# Altium footprint library THU.PcbLib: 477 footprints (part 7 of 30)
Each footprint in its own frame and in the unit in brackets; x right, y up, seen from the top. Pads: shape width x height; smd on the part's side, far side on the other; paste and mask are expansions set on the pad; w line width, h text height; cw(c..) or ccw(c..) is an arc to the next point about the centre after c.
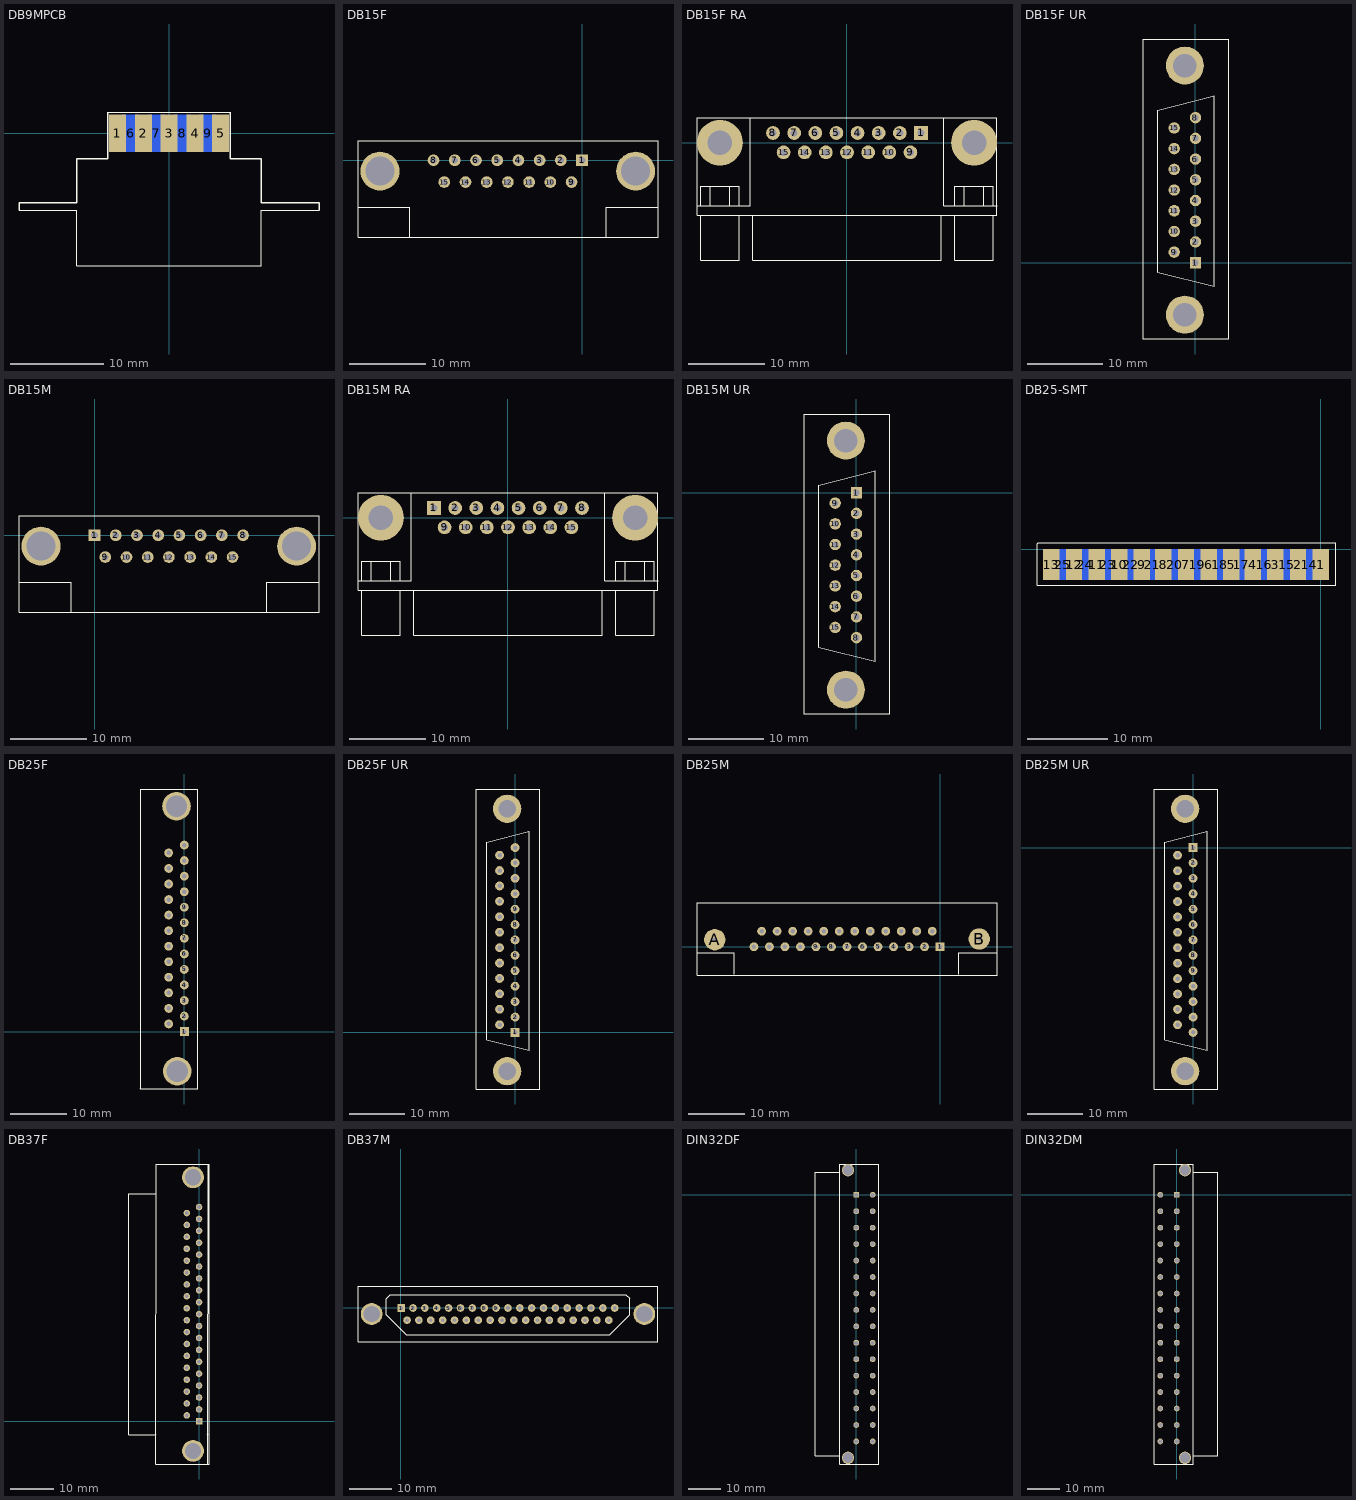
[diagram p6: the footprints below, top view; thin cyan lines are the x and y axes]

## DB9MPCB [mm]
pads (9):
  rect 1.8x4 smd: 1(-5.55,0) 2(-2.75,0) 3(0,0) 4(2.8,0) 5(5.55,0)
  rect 1.8x4 smd far side: 6(-4.125,0) 7(-1.375,0) 8(1.425,0) 9(4.175,0)
TopOverlay:
  lines w0.127: -16.129,-8.255 -9.906,-8.255 -9.906,-14.255 9.906,-14.255 9.906,-8.255 16.129,-8.255 ; -6.604,2.274 -0.009,2.274 6.586,2.274
  lines w0.152: -16.129,-8.255 -16.129,-7.493 -9.906,-7.493 -9.906,-2.726 -6.604,-2.726 -6.604,2.274 ; 6.604,2.274 6.604,-2.726 9.906,-2.726 9.906,-7.493 16.129,-7.493 16.129,-8.255

## DB15F [mil]
pads (17):
  rect 60x60 hole 34: 1(0,0)
  round 60 hole 34: 2(-109,0) 3(-218,0) 4(-327,0) 5(-436,0) 6(-545,0) 7(-654,0) 8(-763,0) 9(-54,-112) 10(-163,-112) 11(-272,-112) 12(-381,-112) 13(-490,-112) 14(-599,-112) 15(-708,-112)
  round 200 hole 149: ""(-1038,-56) ""(275,-56)
TopOverlay:
  lines w6: -1148,-240 -885,-240 -885,-393 ; 125,-393 125,-240 388,-240 ; -1151,-395 -1151,100 390,100 390,-395 -1151,-395

## DB15F RA [mm] "FEMALE DB 15 RA - TYCO CONNECTOR"
height 13.575
pads (17):
  rect 1.8x1.8 hole 0.9: 1(9.695,1.27)
  round 1.8 hole 0.9: 2(6.925,1.27) 3(4.155,1.27) 4(1.385,1.27) 5(-1.385,1.27) 6(-4.155,1.27) 7(-6.925,1.27) 8(-9.695,1.27) 9(8.31,-1.27) 10(5.54,-1.27) 11(2.77,-1.27) 12(0,-1.27) 13(-2.77,-1.27) 14(-5.54,-1.27) 15(-8.31,-1.27)
  round 6 hole 3.2: ""(-16.65,0) ""(16.65,0)
TopOverlay:
  lines w0.152: -19.65,-8.255 -12.7,-8.255 -12.7,3.28 ; -19.177,-9.52 -19.177,-15.42 -14.123,-15.42 -14.123,-9.52 ; -19.177,-8.255 -19.177,-5.715 -14.097,-5.715 -14.097,-8.255 ; -17.907,-8.255 -17.907,-5.715 ; -16.65,0 -16.637,0.013 ; -15.367,-8.255 -15.367,-5.715 ; -12.319,-9.52 -12.319,-15.42 12.319,-15.42 12.319,-9.52 ; 12.7,3.28 12.7,-8.255 19.65,-8.255 ; 14.097,-8.255 14.097,-5.715 19.177,-5.715 19.177,-8.255 ; 14.123,-9.52 14.123,-15.42 19.177,-15.42 19.177,-9.52 ; 15.367,-8.255 15.367,-5.715 ; 17.907,-8.255 17.907,-5.715 ; -19.65,-9.52 -19.65,3.28 19.65,3.28 19.65,-9.52 -19.65,-9.52

## DB15F UR [mil]
pads (17):
  rect 60x60 hole 34: 1(0,0)
  round 60 hole 34: 2(0,109) 3(0,218) 4(0,327) 5(0,436) 6(0,545) 7(0,654) 8(0,763) 9(-112,55) 10(-112,164) 11(-112,273) 12(-112,382) 13(-112,491) 14(-112,600) 15(-112,709)
  round 200 hole 124: ""(-56,-274) ""(-56,1037)
TopOverlay:
  lines w6: -275,-402 -275,1177 175,1177 175,-48 175,-400 -275,-400 ; -200,-50 -200,802 100,877 100,-125 -200,-50

## DB15M [mil]
pads (17):
  rect 60x60 hole 34: 1(0,0)
  round 60 hole 34: 2(109,0) 3(218,0) 4(327,0) 5(436,0) 6(545,0) 7(654,0) 8(763,0) 9(55,-112) 10(164,-112) 11(273,-112) 12(382,-112) 13(491,-112) 14(600,-112) 15(709,-112)
  round 200 hole 149: ""(-275,-56) ""(1038,-56)
TopOverlay:
  lines w6: -383,-240 -120,-240 -120,-393 ; 885,-393 885,-240 1148,-240 ; -388,-395 -388,100 1153,100 1153,-395 -388,-395

## DB15M RA [mm] "MALE DB 15 RA - TYCO CONNECTOR"
height 13.575
pads (17):
  rect 1.8x1.8 hole 0.9: 1(-9.695,1.27)
  round 1.8 hole 0.9: 2(-6.925,1.27) 3(-4.155,1.27) 4(-1.385,1.27) 5(1.385,1.27) 6(4.155,1.27) 7(6.925,1.27) 8(9.695,1.27) 9(-8.31,-1.27) 10(-5.54,-1.27) 11(-2.77,-1.27) 12(0,-1.27) 13(2.77,-1.27) 14(5.54,-1.27) 15(8.31,-1.27)
  round 6 hole 3.2: ""(-16.65,0) ""(16.65,0)
TopOverlay:
  lines w0.152: -19.65,-8.255 -12.7,-8.255 -12.7,3.28 ; -19.177,-9.52 -19.177,-15.42 -14.123,-15.42 -14.123,-9.52 ; -19.177,-8.255 -19.177,-5.715 -14.097,-5.715 -14.097,-8.255 ; -17.907,-8.255 -17.907,-5.715 ; -16.65,0 -16.637,0.013 ; -15.367,-8.255 -15.367,-5.715 ; -12.319,-9.52 -12.319,-15.42 12.319,-15.42 12.319,-9.52 ; 12.7,3.28 12.7,-8.255 19.65,-8.255 ; 14.097,-8.255 14.097,-5.715 19.177,-5.715 19.177,-8.255 ; 14.123,-9.52 14.123,-15.42 19.177,-15.42 19.177,-9.52 ; 15.367,-8.255 15.367,-5.715 ; 17.907,-8.255 17.907,-5.715 ; -19.65,-9.52 19.65,-9.52 19.65,3.28 -19.65,3.28 -19.65,-9.52

## DB15M UR [mil]
pads (17):
  rect 60x60 hole 34: 1(0,0)
  round 60 hole 34: 2(0,-109) 3(0,-218) 4(0,-327) 5(0,-436) 6(0,-545) 7(0,-654) 8(0,-763) 9(-112,-55) 10(-112,-164) 11(-112,-273) 12(-112,-382) 13(-112,-491) 14(-112,-600) 15(-112,-709)
  round 200 hole 124: ""(-56,-1037) ""(-56,274)
TopOverlay:
  lines w6: -275,-1165 -275,414 175,414 175,-811 175,-1163 -275,-1163 ; -200,-813 100,-888 100,114 -200,39 -200,-813

## DB25-SMT [mil]
pads (25):
  rect 80x150 smd: 1(0,-75) 2(-110,-75) 3(-220,-75) 4(-330,-75) 5(-435,-75) 6(-545,-75) 7(-655,-75) 8(-765,-75) 9(-870,-75) 10(-980,-75) 11(-1090,-75) 12(-1200,-75) 13(-1310,-75)
  rect 80x150 smd far side: 14(-55,-75) 15(-165,-75) 16(-275,-75) 17(-385,-75) 18(-490,-75) 19(-600,-75) 20(-710,-75) 21(-820,-75) 22(-925,-75) 23(-1035,-75) 24(-1145,-75) 25(-1255,-75)
TopOverlay:
  lines w6: -1380,-175 -1380,25 -1375,30 75,30 75,-175 -1380,-175

## DB25F [mil]
pads (27):
  rect 62x62 hole 32: 1(0,0)
  round 62 hole 32: 2(0,109) 3(0,218) 4(0,327) 5(0,436) 6(0,545) 7(0,654) 8(0,763) 9(0,872) 10(0,981) 11(0,1090) 12(0,1199) 13(0,1308) 14(-110,54) 15(-110,163) 16(-110,272) 17(-110,381) 18(-110,490) 19](-110,599) 20(-110,708) 21(-110,817) 22(-110,926) 23(-110,1035) 24(-110,1144) 25(-110,1253)
  round 200 hole 149: ""(-55,1580) ""(-50,-277)
TopOverlay:
  lines w6: -310,-400 -307,-397 -307,1701 95,1701 95,-402 ; -308,-402 95,-402 ; 93,-400 95,-402

## DB25F UR [mil]
pads (27):
  rect 62x62 hole 32: 1(0,0)
  round 62 hole 32: 2(0,109) 3(0,218) 4(0,327) 5(0,436) 6(0,545) 7(0,654) 8(0,763) 9(0,872) 10(0,981) 11(0,1090) 12(0,1199) 13(0,1308) 14(-110,55) 15(-110,164) 16(-110,273) 17(-110,382) 18(-110,491) 19(-110,600) 20(-110,709) 21(-110,818) 22(-110,927) 23(-110,1036) 24(-110,1145) 25(-110,1254)
  round 200 hole 124: ""(-56,-274) ""(-56,1582)
TopOverlay:
  lines w6: 175,497 175,1722 -275,1722 -275,-400 175,-400 175,498 ; -200,-50 -200,1347 100,1422 100,-125 -200,-50

## DB25M [mil]
pads (27):
  rect 62x62 hole 32: 1(0,0)
  round 62 hole 32: 2(-109,0) 3(-218,0) 4(-327,0) 5(-436,0) 6(-545,0) 7(-654,0) 8(-763,0) 9(-872,0) 10(-981,0) 11(-1090,0) 12(-1199,0) 13(-1308,0) 14(-55,110) 15(-164,110) 16(-273,110) 17(-382,110) 18(-491,110) 19(-600,110) 20(-709,110) 21(-818,110) 22(-927,110) 23(-1036,110) 24(-1145,110) 25(-1254,110)
  round 150 hole 32: A(-1583,50) B(275,55)
TopOverlay:
  lines w6: -1708,-40 -1445,-40 -1445,-193 ; 130,-193 130,-40 393,-40 ; -1708,-200 -1708,310 400,310 400,-200 -1708,-200

## DB25M UR [mil]
pads (27):
  rect 62x62 hole 32: 1(0,0)
  round 62 hole 32: 2(0,-109) 3(0,-218) 4(0,-327) 5(0,-436) 6(0,-545) 7(0,-654) 8(0,-763) 9(0,-872) 10(0,-981) 11(0,-1090) 12(0,-1199) 13(0,-1308) 14(-110,-55) 15(-110,-164) 16(-110,-273) 17(-110,-382) 18(-110,-491) 19(-110,-600) 20(-110,-709) 21(-110,-818) 22(-110,-927) 23(-110,-1036) 24(-110,-1145) 25(-110,-1254)
  round 200 hole 124: ""(-56,-1582) ""(-56,274)
TopOverlay:
  lines w6: 175,-811 175,414 -275,414 -275,-1708 175,-1708 175,-810 ; -200,-1358 -200,39 100,114 100,-1433 -200,-1358

## DB37F [mil]
pads (39):
  rect 60x60 hole 34: 1(0,0)
  round 60 hole 34: 2(0,109) 3(0,218) 4(0,327) 5(0,436) 6(0,545) 7(0,654) 8(0,763) 9(0,872) 10(0,981) 11(0,1090) 12(0,1199) 13(0,1308) 14(0,1417) 15(0,1526) 16(0,1635) 17(0,1744) 18(0,1853) 19(0,1962) 20(-112,54) 21(-112,163) 22(-112,272) 23(-112,381) 24(-112,490) 25(-112,599) 26(-112,708) 27(-112,817) 28(-112,926) 29(-112,1035) 30(-112,1144) 31(-112,1253) 32(-112,1362) 33(-112,1471) 34(-112,1580) 35(-112,1689) 36(-112,1798) 37(-112,1907)
  round 200 hole 149: ""(-55,-271) ""(-55,2234)
TopOverlay:
  lines w6: -390,-115 -400,-125 -645,-125 -645,2085 -390,2085 ; 75,-122 85,-112 ; 80,-388 83,2356 ; -395,-391 95,-391 95,2355 -392,2353 -395,-391

## DB37M [mil] "DB 37 MALE CONNECTOR"
pads (39):
  rect 70x70 hole 34: 1(1.97,-1.97)
  round 70 hole 34: 2(110.97,-1.97) 3(219.97,-1.97) 4(328.97,-1.97) 5(437.97,-1.97) 6(546.97,-1.97) 7(655.97,-1.97) 8(764.97,-1.97) 9(873.97,-1.97) 10(982.97,-1.97) 11(1091.97,-1.97) 12(1200.97,-1.97) 13(1309.97,-1.97) 14(1418.97,-1.97) 15(1527.97,-1.97) 16(1636.97,-1.97) 17(1745.97,-1.97) 18(1854.97,-1.97) 19(1963.97,-1.97) 20(55.97,-113.97) 21(164.97,-113.97) 22(273.97,-113.97) 23(382.97,-113.97) 24(491.97,-113.97) 25(600.97,-113.97) 26(709.97,-113.97) 27(818.97,-113.97) 28(927.97,-113.97) 29(1036.97,-113.97) 30(1145.97,-113.97) 31(1254.97,-113.97) 32(1363.97,-113.97) 33(1472.97,-113.97) 34(1581.97,-113.97) 35(1690.97,-113.97) 36(1799.97,-113.97) 37(1908.97,-113.97)
  round 200 hole 149: ""(-269.03,-56.97) ""(2235.97,-56.97)
TopOverlay:
  lines w6: 2361.22,-312.87 -394.69,-312.87 -394.69,198.94 2361.22,198.94 ; 2361.62,-312.87 2361.62,198.94 ; -134.84,-63.74 50.2,-248.78 1916.34,-248.78 2101.38,-63.74 2101.38,86.61 2066.69,121.3 -97.2,121.3 -134.84,83.66 -134.84,-63.74

## DIN32DF [mil]
pads (34):
  rect 70x70 hole 49: 2(0,0)
  round 70 hole 49: 4(0,-200) 6(0,-400) 8(0,-600) 10(0,-800) 12(0,-1000) 14(0,-1200) 16(0,-1400) 18(0,-1600) 20(0,-1800) 22(0,-2000) 24(0,-2200) 26(0,-2400) 28(0,-2600) 30(0,-2800) 32(0,-3000) 66(200,0) 68(200,-200) 70(200,-400) 72(200,-600) 74(200,-800) 76(200,-1000) 78(200,-1200) 80(200,-1400) 82(200,-1600) 84(200,-1800) 86(200,-2000) 88(200,-2200) 90(200,-2400) 92(200,-2600) 94(200,-2800) 96(200,-3000)
  round 150 hole 125: ""(-100,-3200) ""(-100,300)
TopOverlay:
  lines w6: -200,-3175 -500,-3175 -500,275 -200,275 ; -200,-3275 275,-3275 275,375 -200,375 -200,-3275

## DIN32DM [mil]
pads (34):
  rect 70x70 hole 49: 2(0,0)
  round 70 hole 49: 4(0,-200) 6(0,-400) 8(0,-600) 10(0,-800) 12(0,-1000) 14(0,-1200) 16(0,-1400) 18(0,-1600) 20(0,-1800) 22(0,-2000) 24(0,-2200) 26(0,-2400) 28(0,-2600) 30(0,-2800) 32(0,-3000) 66(-200,0) 68(-200,-200) 70(-200,-400) 72(-200,-600) 74(-200,-800) 76(-200,-1000) 78(-200,-1200) 80(-200,-1400) 82(-200,-1600) 84(-200,-1800) 86(-200,-2000) 88(-200,-2200) 90(-200,-2400) 92(-200,-2600) 94(-200,-2800) 96(-200,-3000)
  round 150 hole 125: ""(100,-3200) ""(100,300)
TopOverlay:
  lines w6: 200,-3175 500,-3175 500,275 200,275 ; -275,-3275 200,-3275 200,375 -275,375 -275,-3275